# Altium integrated library vh_altium_library.intLib: 963 symbols (part 4 of 5)
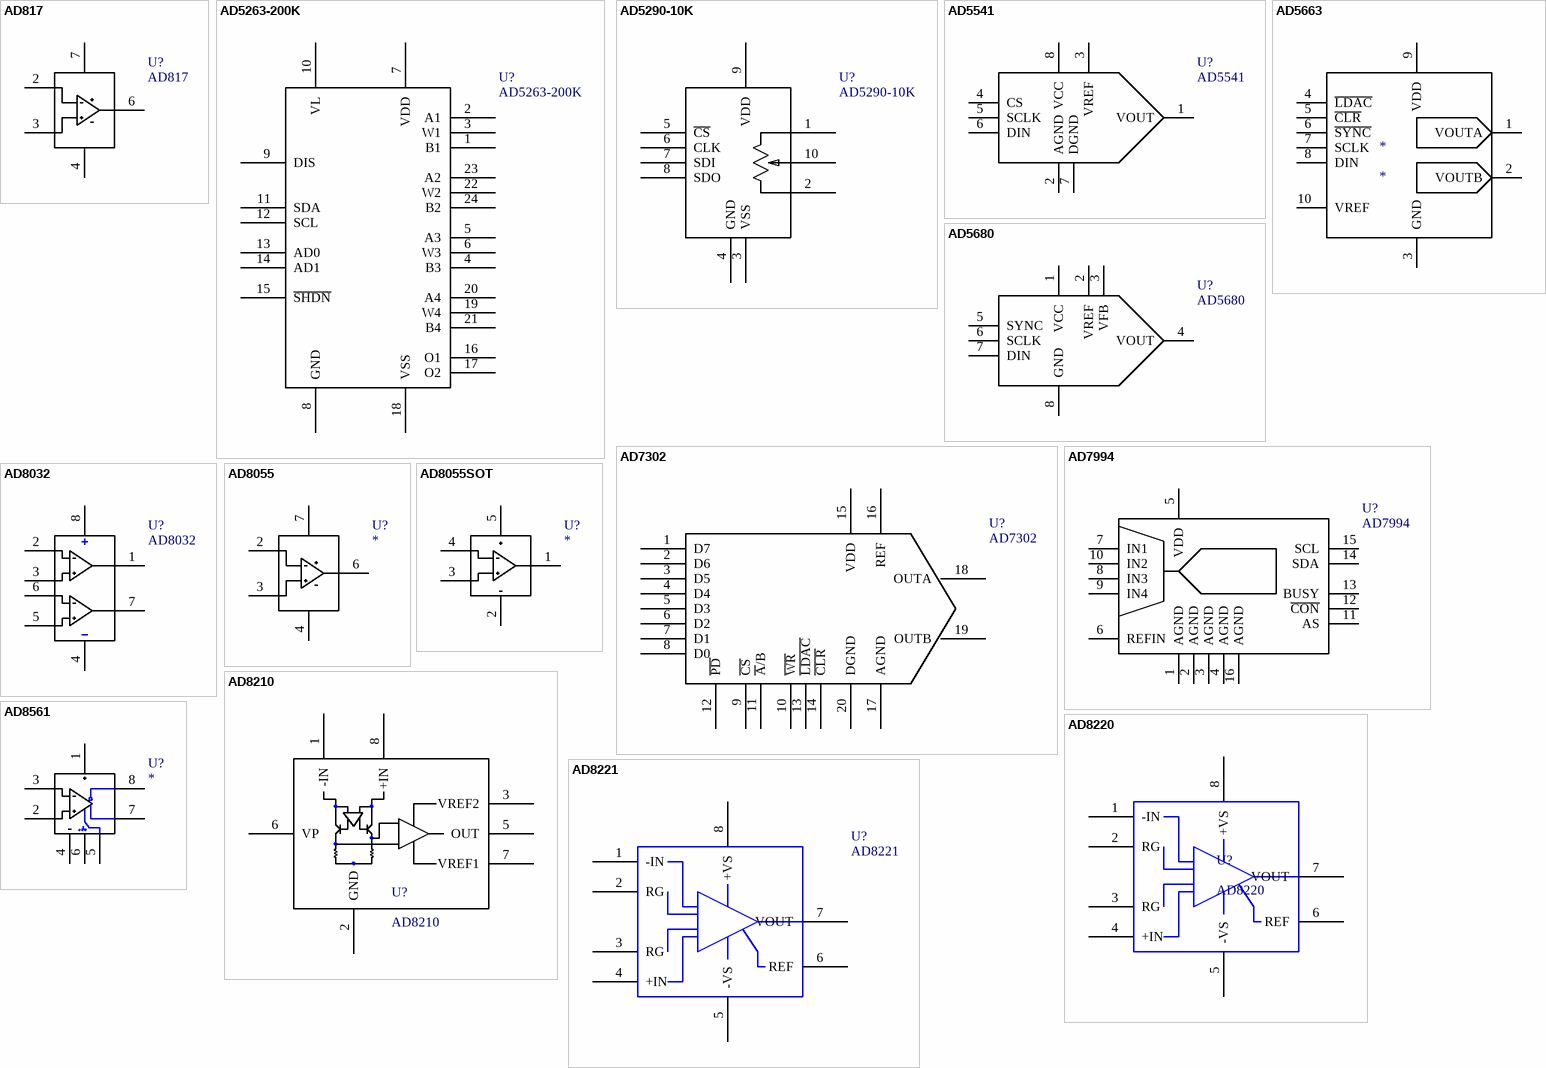
[diagram p71: symbols AD817 to AD8561]

## AD8055SOT
designator U?
OPAMP SOT23; Manufacturer Part Number: AD8055ARTZ-REEL7; Manufacturer: Analog Devices Inc; Text Field1: ST; Text Field2: LM2903DT; Text Field3: Avnet; Text Field5: SO8; Text Field6: 0.078; Current - Input Bias: 400nA; Number of Circuits: 1; Description: IC OPAMP VF LDIST LN LP SOT23-5; Current - Output / Channel: 60mA; Voltage - Input Offset: 3000µV; Amplifier Type: Voltage Feedback; Current - Supply: 5.4mA; Slew Rate: 1400 V/µs; Voltage - Supply, Single/Dual (±): 8 V ~ 12 V, ±4 V ~ 6 V; Text Field4: LM2903DT; NI?: *; O?: *; Section:: *; Supplier 1: Digi-Key; Supplier Part Number 1: AD8055ARTZ-REEL7TR-ND; Operating Temperature: -40°C ~ 125°C; Supplier: Digi-Key; Gain Bandwidth Product: -; Package / Case: SOT-23-5, SC-74A, SOT-25; Output Type: -; Supplier Part Number: AD8055ARTZ-REEL7TR-ND; Packaging: Tape & Reel (TR); Category: Integrated Circuits (ICs); RoHS: RoHS Compliant
footprint SOT23-5
pins: 1, 2, 3, 4, 5

## AD8210
designator U?
INSTRUMENTATION AMPLIFIER
footprint SO8
pins: 1 -IN, 2 GND, 3 VREF2, 5 OUT, 6 VP, 7 VREF1, 8 +IN

## AD8220
designator U?
INSTRUMENTATION AMPLIFIER; Manufacturer: Analog Devices Inc; Manufacturer Part Number: AD8220ARMZ-R7; Current - Input Bias: 25pA; Voltage - Supply, Single/Dual (±): 4.5 V ~ 36 V, ±2.25 V ~ 18 V; Voltage - Input Offset: 250µV; Current - Supply: 750µA; Current - Output / Channel: 15mA; Slew Rate: 2 V/µs; Description: IC AMP INST JFET R-R 15MA 8MSOP; Output Type: Rail-to-Rail; Number of Circuits: 1; Supplier 1: Digi-Key; Supplier Part Number 1: AD8220ARMZ-R7TR-ND; Package / Case: 8-MSOP, Micro8™, 8-uMAX, 8-uSOP,; Operating Temperature: -40°C ~ 85°C; Packaging: Tape & Reel (TR); Supplier Part Number: AD8220ARMZ-R7TR-ND; Gain Bandwidth Product: -; Amplifier Type: Instrumentation; RoHS: RoHS Compliant; Supplier: Digi-Key; Category: Integrated Circuits (ICs)
footprint MSOP8
pins: 1 -IN, 2 RG, 3 RG, 4 +IN, 5 -VS, 6 REF, 7 VOUT, 8 +VS

## AD8221
designator U?
INSTRUMENTATION AMPLIFIER; Manufacturer: Analog Devices Inc; Manufacturer Part Number: AD8221ARZ-RL; Current - Input Bias: 500pA; Description: IC AMP INST PREC LN 18MA 8SOIC; Voltage - Input Offset: 60µV; Voltage - Supply, Single/Dual (±): ±2.3 V ~ 18 V; Slew Rate: 2 V/µs; Number of Circuits: 1; Current - Supply: 900µA; Current - Output / Channel: 18mA; Supplier 1: Digi-Key; Supplier Part Number 1: AD8221ARZ-RL-ND; Package / Case: 8-SOIC (3.9mm Width); Output Type: -; Gain Bandwidth Product: -; Operating Temperature: -40°C ~ 85°C; Packaging: Tape & Reel (TR); RoHS: RoHS Compliant; Supplier: Digi-Key; Category: Integrated Circuits (ICs); Supplier Part Number: AD8221ARZ-RL-ND; Amplifier Type: Instrumentation
footprint SO8
pins: 1 -IN, 2 RG, 3 RG, 4 +IN, 5 -VS, 6 REF, 7 VOUT, 8 +VS

## AD8561
designator U?
ULTRAFAST COMPARATOR; Manufacturer Part Number: AD8561AR-REEL; Manufacturer: Analog Devices Inc; Text Field1: ST; Text Field2: LM2903DT; Text Field3: Avnet; Text Field5: SO8; Text Field6: 0.078; Output Type: CMOS, Complementary, TTL; Voltage - Supply: 3 V ~ 10 V, ±1.5 V ~ 5 V; Description: IC COMP 7NS ULTRA-FAST 8-SOIC; Number of Elements: 1; Text Field4: LM2903DT; NI?: *; O?: *; Section:: *; Supplier 1: Digi-Key; Supplier Part Number 1: AD8561AR-REEL-ND; Packaging: Tape & Reel (TR); Package / Case: 8-SOIC (3.9mm Width); Category: Integrated Circuits (ICs); Type: General Purpose; Supplier Part Number: AD8561AR-REEL-ND; Supplier: Digi-Key; RoHS: RoHS non-compliant
footprint SO8
pins: 1, 2, 3, 4, 5, 6, 7, 8

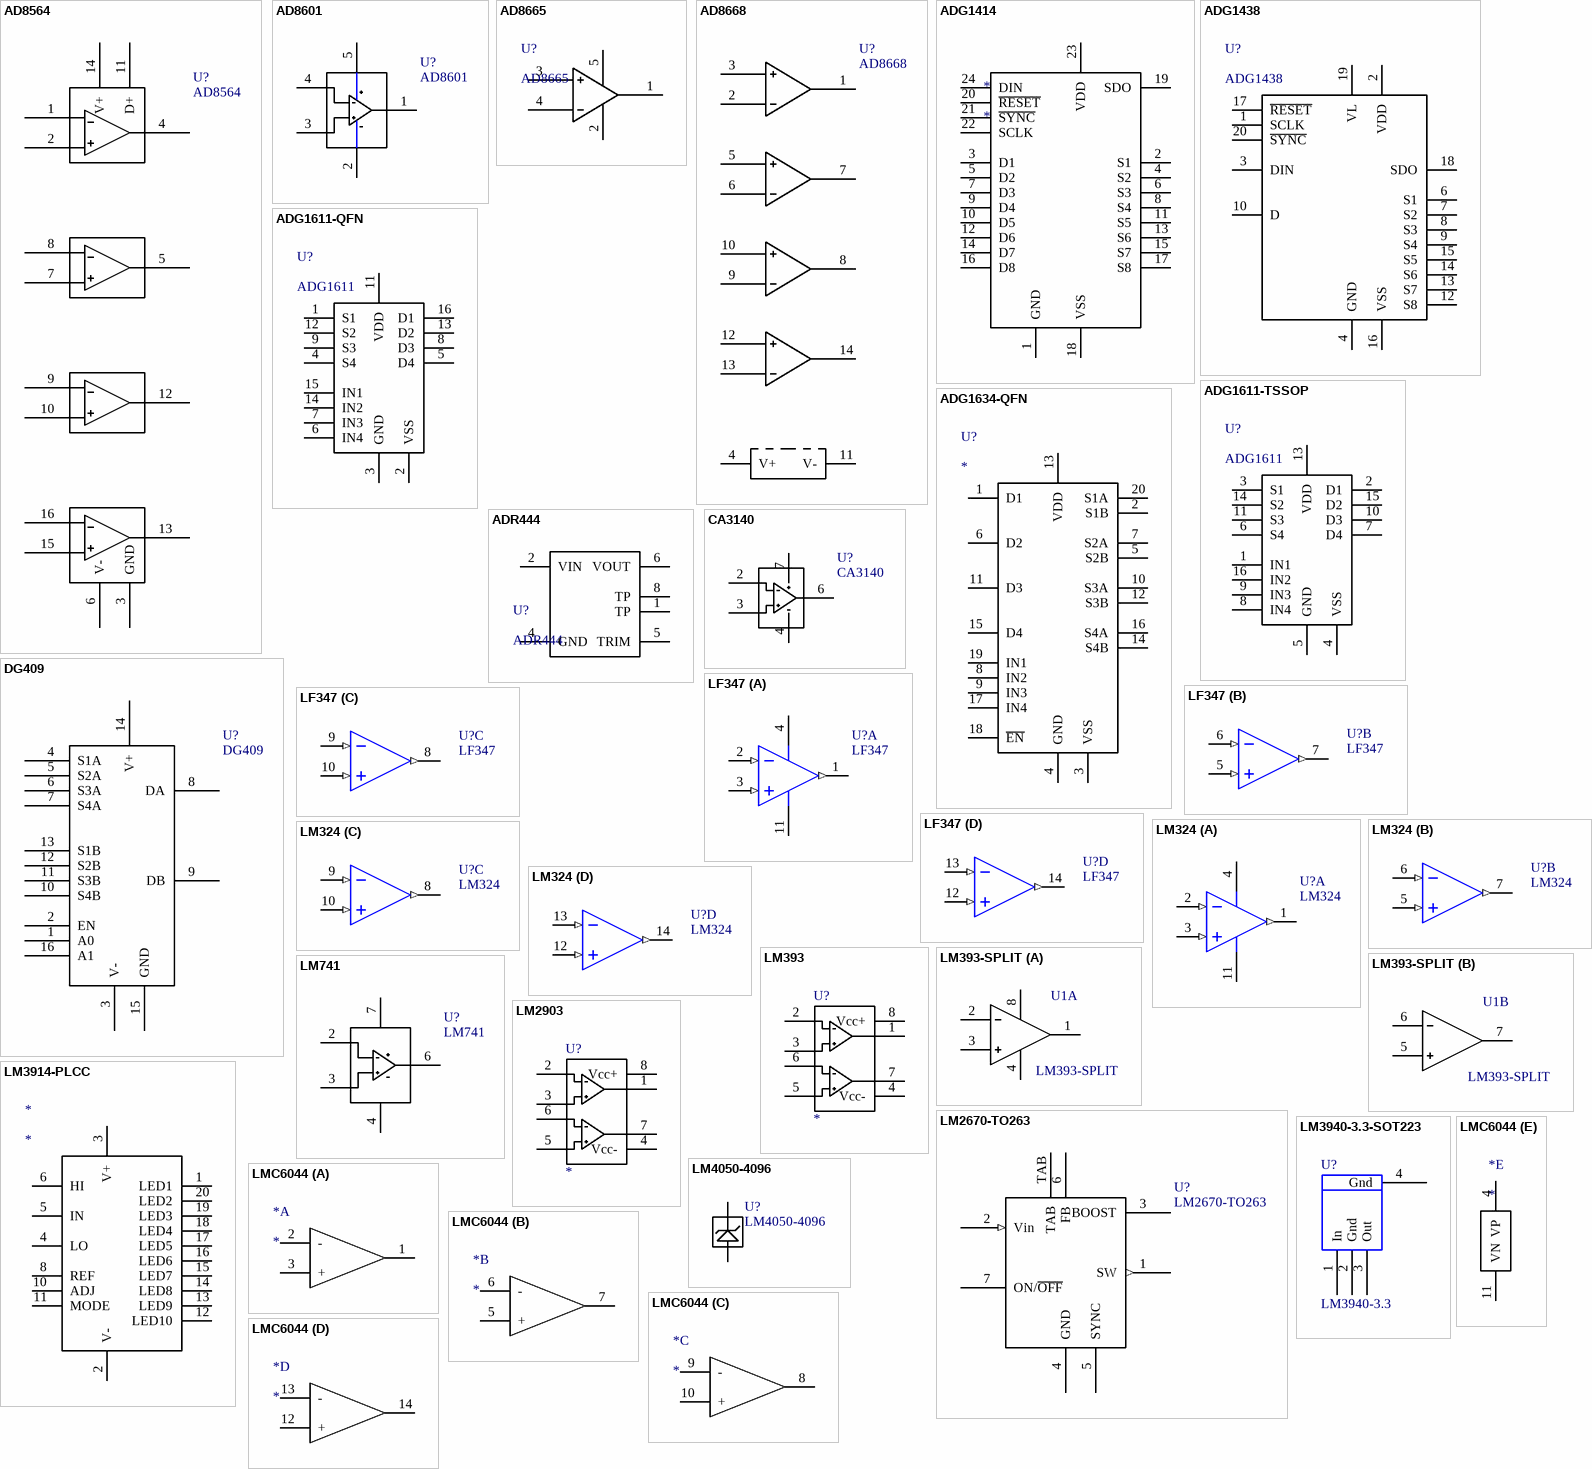
[diagram p41: symbols AD8564 to LMC6044]

## AD8564
designator U?
QUAD FAST COMPARATOR; Manufacturer Part Number: AD8564ARZ; Manufacturer: Analog Devices Inc; Description: IC COMPARATOR QUAD 7NS 16-SOIC; Output Type: CMOS, TTL; Number of Elements: 4; Supplier 1: Digi-Key; Supplier Part Number 1: AD8564ARZ-ND; Package / Case: 16-SOIC (3.9mm Width); RoHS: RoHS Compliant; Type: General Purpose; Packaging: Tube; Supplier: Digi-Key; Category: Integrated Circuits (ICs); Voltage - Supply: -; Supplier Part Number: AD8564ARZ-ND
footprint SO16
pins: 1 -A, 2 +A, 3 GND, 4 OA, 5 OB, 6 V-, 7 +B, 8 -B, 9 -C, 10 +C, 11 D+, 12 OC, 13 OD, 14 V+, 15 +D, 16 -D

## AD8601
designator U?
RAIL TO RAIL OPAMP; Manufacturer: Analog Devices Inc; Manufacturer Part Number: AD8601WDRTZ-REEL7; Text Field1: ST; Text Field2: LM2903DT; Text Field3: Avnet; Text Field5: SO8; Text Field6: 0.078; Voltage - Input Offset: 1300µV; Current - Supply: 750µA; Description: IC AMP GP R-R I/O SGL SOT23-5; Number of Circuits: 1; Slew Rate: 6 V/µs; Voltage - Supply, Single/Dual (±): 2.7 V ~ 5.5 V; Current - Input Bias: 0.2pA; Amplifier Type: General Purpose; Output Type: Rail-to-Rail; Current - Output / Channel: 50mA; Gain Bandwidth Product: 8.4MHz; Text Field4: LM2903DT; NI?: *; O?: *; Section:: *; Supplier 1: Digi-Key; Supplier Part Number 1: AD8601WDRTZ-REEL7CT-ND; RoHS: RoHS Compliant; Category: Integrated Circuits (ICs); Supplier Part Number: AD8601WDRTZ-REEL7CT-ND; Operating Temperature: -40°C ~ 125°C; Packaging: Cut Tape (CT); Supplier: Digi-Key; Package / Case: SOT-23-5, SC-74A, SOT-25
footprint SOT23-5
pins: 1, 2, 3, 4, 5

## AD8665
designator U?
Supplier 1: Digi-Key; Supplier Part Number 1: AD8665ARJZ-REEL7TR-ND
pins: 1 a, 2 VP, 3 +, 4 -, 5 VP

## AD8668
designator U?
QUAD COMPARATOR SO16; Manufacturer Part Number: LT1721CS; Manufacturer: Linear Technology; Output Type: CMOS, Rail-to-Rail, TTL; Description: IC COMP R-RINOUT QUAD 16-SOIC; Number of Elements: 4; Voltage - Supply: 2.7 V ~ 6 V; Supplier 1: Digi-Key; Supplier Part Number 1: LT1721CS-ND; Supplier: Digi-Key; RoHS: RoHS non-compliant; Type: General Purpose; Package / Case: 16-SOIC (3.9mm Width); Category: Integrated Circuits (ICs); Supplier Part Number: LT1721CS-ND; Packaging: Tube
footprint SO14
pins: 1 a, 2 -, 3 +, 4 V+, 5 +, 6 -, 7 b, 8 D, 9 -, 10 +, 11 V-, 12 +, 13 -, 14 C

## ADG1414
designator *
footprint LFCSP-24 (QFN, 24-Leads, Body 4.2x4.2mm (max), Pitch 0.50mm, IPC Medium Density)
pins: 1 GND, 2 S1, 3 D1, 4 S2, 5 D2, 6 S3, 7 D3, 8 S4, 9 D4, 10 D5, 11 S5, 12 D6, 13 S6, 14 D7, 15 S7, 16 D8, 17 S8, 18 VSS, 19 SDO, 20 ~{RESET}, 21 ~{SYNC}, 22 SCLK, 23 VDD, 24 DIN

## ADG1438
designator U?
footprint TSSOP20
pins: 1 SCLK, 2 VDD, 3 DIN, 4 GND, 6 S1, 7 S2, 8 S3, 9 S4, 10 D, 12 S8, 13 S7, 14 S6, 15 S5, 16 VSS, 17 ~{RESET}, 18 SDO, 19 VL, 20 ~{SYNC}

## ADG1611-QFN
designator U?, comment ADG1611
footprint LFCSP-16
pins: 1 S1, 2 VSS, 3 GND, 4 S4, 5 D4, 6 IN4, 7 IN3, 8 D3, 9 S3, 11 VDD, 12 S2, 13 D2, 14 IN2, 15 IN1, 16 D1

## ADG1611-TSSOP
designator U?, comment ADG1611
footprint TSSOP16
pins: 1 IN1, 2 D1, 3 S1, 4 VSS, 5 GND, 6 S4, 7 D4, 8 IN4, 9 IN3, 10 D3, 11 S3, 13 VDD, 14 S2, 15 D2, 16 IN2

## ADG1634-QFN
designator U?
footprint LFCSP-20
pins: 1 D1, 2 S1B, 3 VSS, 4 GND, 5 S2B, 6 D2, 7 S2A, 8 IN2, 9 IN3, 10 S3A, 11 D3, 12 S3B, 13 VDD, 14 S4B, 15 D4, 16 S4A, 17 IN4, 18 ~{EN}, 19 IN1, 20 S1A

## ADR444
designator U?
Supplier 1: Digi-Key; Supplier Part Number 1: ADR444ARZ-ND
pins: 1 TP, 2 VIN, 4 GND, 5 TRIM, 6 VOUT, 8 TP

## CA3140
designator U?
BIMOS OPAMP; Manufacturer: Intersil; Manufacturer Part Number: CA3140MZ; Text Field1: ST; Text Field2: LM2903DT; Text Field3: Avnet; Text Field5: SO8; Text Field6: 0.078; Voltage - Input Offset: 5000µV; Gain Bandwidth Product: 4.5MHz; Slew Rate: 9 V/µs; Current - Input Bias: 10pA; Voltage - Supply, Single/Dual (±): 4 V ~ 36 V, ±2 V ~ 18 V; Description: IC OPAMP BIMOS 4.5MHZ 8SOIC; Amplifier Type: General Purpose; Number of Circuits: 1; Current - Supply: 4mA; Current - Output / Channel: 40mA; Text Field4: LM2903DT; NI?: *; O?: *; Section:: *; Supplier 1: Digi-Key; Supplier Part Number 1: CA3140MZ-ND; Supplier: Digi-Key; Package / Case: 8-SOIC (3.9mm Width); Operating Temperature: -55°C ~ 125°C; RoHS: RoHS Compliant; Category: Integrated Circuits (ICs); Supplier Part Number: CA3140MZ-ND; Packaging: Tube; Output Type: -
footprint SO8
pins: 2, 3, 4, 6, 7

## DG409
designator U?
DIFFERENTIAL 4 CHANNEL MULTIPLEXER; Manufacturer Part Number: DG409DY-T1-E3; Manufacturer: Vishay/Siliconix; On-State Resistance: 100 Ohm; Voltage - Supply, Single/Dual (±): ±5 V ~ 20 V; Circuit: 2 x 4:2; Current - Supply: 1µA; Voltage Supply Source: Dual Supply; Description: IC MULTIPLEXER DUAL 4X1 16SOIC; Supplier 1: Digi-Key; Supplier Part Number 1: DG409DY-T1-E3DKR-ND; Function: Multiplexer; Mounting Type: Surface Mount; Operating Temperature: -40°C ~ 85°C; Category: Integrated Circuits (ICs); Supplier Part Number: DG409DY-T1-E3DKR-ND; Supplier: Digi-Key; Package / Case: 16-SOIC (3.9mm Width); Packaging: Digi-Reel®; RoHS: RoHS Compliant
footprint SO16
pins: 1 A0, 2 EN, 3 V-, 4 S1A, 5 S2A, 6 S3A, 7 S4A, 8 DA, 9 DB, 10 S4B, 11 S3B, 12 S2B, 13 S1B, 14 V+, 15 GND, 16 A1

## LF347
designator U?
Low Power Quad Operational Amplifier; Manufacturer Part Number: LF347BD; Manufacturer: Texas Instruments; Text Field1: pristel=Nsc\nsanopea\<parttype>.ckt; Slew Rate: 13 V/µs; Voltage - Supply, Single/Dual (±): 7 V ~ 36 V, ±3.5 V ~ 18 V; Current - Input Bias: 50pA; Voltage - Input Offset: 3000µV; Number of Circuits: 4; Gain Bandwidth Product: 3MHz; Description: IC OPAMP JFET 3MHZ QUAD 14SOIC; Amplifier Type: J-FET; Current - Supply: 8mA; Supplier 1: Digi-Key; Supplier Part Number 1: 296-7136-5-ND; Package / Case: 14-SOIC (3.9mm Width), 14-SOL; Supplier: Digi-Key; Current - Output / Channel: -; Packaging: Tube; RoHS: RoHS Compliant; Output Type: -; Operating Temperature: 0°C ~ 70°C; Category: Integrated Circuits (ICs); Supplier Part Number: 296-7136-5-ND
footprint SO14
part A pins: 1 1 OUT (out), 2 1 IN- (in), 3 1 IN+ (in), 4 VCC (power), 11 VEE (power)
part B pins: 5 2 IN+ (in), 6 2 IN- (in), 7 2 OUT (out)
part C pins: 8 3 OUT (out), 9 3 IN- (in), 10 3 IN+ (in)
part D pins: 12 4 IN+ (in), 13 4 IN- (in), 14 4 OUT (out)

## LM324
designator U?
Low Power Quad Operational Amplifier
footprint SO14
part A pins: 1 1 OUT (out), 2 1 IN- (in), 3 1 IN+ (in), 4 VCC (power), 11 VEE (power)
part B pins: 5 2 IN+ (in), 6 2 IN- (in), 7 2 OUT (out)
part C pins: 8 3 OUT (out), 9 3 IN- (in), 10 3 IN+ (in)
part D pins: 12 4 IN+ (in), 13 4 IN- (in), 14 4 OUT (out)

## LM393
designator U?
IC DUAL COMPARATOR
footprint SO8
pins: 1, 2, 3, 4 Vcc-, 5, 6, 7, 8 Vcc+

## LM393-SPLIT
designator U1
IC DUAL COMPARATOR; Supplier 1: Digi-Key; Supplier Part Number 1: LM393MXFSDKR-ND
footprint SO8
part A pins: 1, 2, 3, 4 Vcc-, 8 Vcc+
part B pins: 5, 6, 7

## LM741
designator U?
OPAMP
footprint SO8
pins: 2, 3, 4, 6, 7

## LM2670-TO263
designator U?
3A, HIGH EFFICIENCY STEP-DOWN VR; Manufacturer Part Number: LM2670S-3.3/NOPB; Text Field4: NATIONAL SEMICONDUCTOR; Text Field7: JAMES CHUNG; Description: IC REG SIMPLE SWITCHER TO-263-7; Voltage - Input: 8 ~ 40 V; Synchronous: Yes; Voltage - Output: 3.3V; Rds (On): 150 mOhm; Number of Outputs: 1; Frequency - Switching: 260kHz; Supplier 1: Digi-Key; Supplier Part Number 1: LM2670S-3.3-ND; Current - Output: 3A; Power - Output: -; Manufacturer: National Semiconductor; Operating Temperature: -40°C ~ 125°C; Supplier: Digi-Key; Category: Integrated Circuits (ICs); Package / Case: D²Pak, TO-263 (7 leads + tab); Supplier Part Number: LM2670S-3.3-ND; Type: Step-Down (Buck); Packaging: Tube; Internal Switch(s): Yes; RoHS: RoHS Compliant
footprint TO263-7
pins: 1 SW (out), 2 Vin (in), 3 BOOST, 4 GND (power), 5 SYNC, 6 FB, 7 ON/~{OFF}, TAB

## LM2903
designator U?
IC DUAL COMPARATOR; Manufacturer: STMicroelectronics; Manufacturer Part Number: LM2903HDT; Text Field1: ST; Text Field2: LM2903DT; Text Field3: Avnet; Text Field5: SO8; Text Field6: 0.078; Voltage - Supply: 2 V ~ 36 V, ±1 V ~ 18 V; Output Type: CMOS, DTL, ECL, MOS, Open-Collector, TTL; Description: IC COMPARATOR DUAL LOW PWR 8SOIC; Number of Elements: 2; Text Field4: LM2903DT; NI?: *; O?: *; Section:: *; Supplier 1: Digi-Key; Supplier Part Number 1: 497-4260-2-ND; RoHS: RoHS non-compliant; Package / Case: 8-SOIC (3.9mm Width); Supplier Part Number: 497-4260-2-ND; Type: General Purpose; Supplier: Digi-Key; Category: Integrated Circuits (ICs); Packaging: Tape & Reel (TR)
footprint SO8
pins: 1, 2, 3, 4 Vcc-, 5, 6, 7, 8 Vcc+

## LM3914-PLCC
designator *
Supplier 1: Digi-Key; Supplier Part Number 1: LM3914V-ND
footprint PLCC20 (Footprint not found)
pins: 1 LED1, 2 V-, 3 V+, 4 LO, 5 IN, 6 HI, 8 REF, 10 ADJ, 11 MODE, 12 LED10, 13 LED9, 14 LED8, 15 LED7, 16 LED6, 17 LED5, 18 LED4, 19 LED3, 20 LED2

## LM3940-3.3-SOT223
designator U?, comment LM3940-3.3
3.3 VOLT LINEAR REGULATOR SOT223; Manufacturer: National Semiconductor; Manufacturer Part Number: LM3940IMP-3.3/NOPB; Description: IC REGULATOR LDO 3.3V SOT223-3; Number of Regulators: 1; Regulator Topology: Positive Fixed; Voltage - Output: 3.3V; Current - Output: 1A; Voltage - Input: 4.5 ~ 5.5 V; Voltage - Dropout (Typical): 0.11V @ 100mA; Supplier 1: Digi-Key; Supplier Part Number 1: LM3940IMP-3.3DKR-ND; Package / Case: SOT-223 (3 leads + Tab), SC-73, TO-261AA; Operating Temperature: -40°C ~ 125°C; Supplier Part Number: LM3940IMP-3.3DKR-ND; Supplier: Digi-Key; Current - Limit (Min): -; Packaging: Digi-Reel®; RoHS: RoHS Compliant; Category: Integrated Circuits (ICs)
footprint SOT223
pins: 1 In, 2 Gnd, 3 Out, 4 Gnd

## LM4050-4096
designator U?
REFERENCE DIODE 4.096 VOLT; Manufacturer Part Number: LT1962EMS8-1.5#PBF; Manufacturer: Linear Technology; Tolerance: ±0.2%; Description: IC REG LDO 1.5V 300MA LN 8MSOP; Temperature Coefficient: 50ppm/°C; Number of Channels: 1; Voltage - Output: 1.5V; Reference Type: Shunt; Voltage - Input: 1.8 ~ 20 V; Current - Output: 300mA; Current - Cathode: 60µA; Voltage - Dropout (Typical): 0.27V @ 300mA; Current - Limit (Min): 320mA; Regulator Topology: Positive Fixed; Supplier 1: Digi-Key; Supplier Part Number 1: LM4050BIM3-2.5DKR-ND; Supplier Part Number: LM4050BIM3-2.5DKR-ND; RoHS: RoHS Compliant; Supplier: Digi-Key; Package / Case: 8-MSOP, Micro8™, 8-uMAX, 8-uSOP,; Packaging: Tube; Category: Integrated Circuits (ICs); Operating Temperature: -40°C ~ 125°C; Current - Quiescent: -; Number of Regulators: 1
footprint SOT23-123
pins: 1, 2

## LMC6044
designator *
Supplier 1: Digi-Key; Supplier Part Number 1: LMC6044AIMX-ND
footprint SO14
part A pins: 1, 2 -, 3 +
part B pins: 5 +, 6 -, 7
part C pins: 8, 9 -, 10 +
part D pins: 12 +, 13 -, 14
part E pins: 4 VP, 11 VN

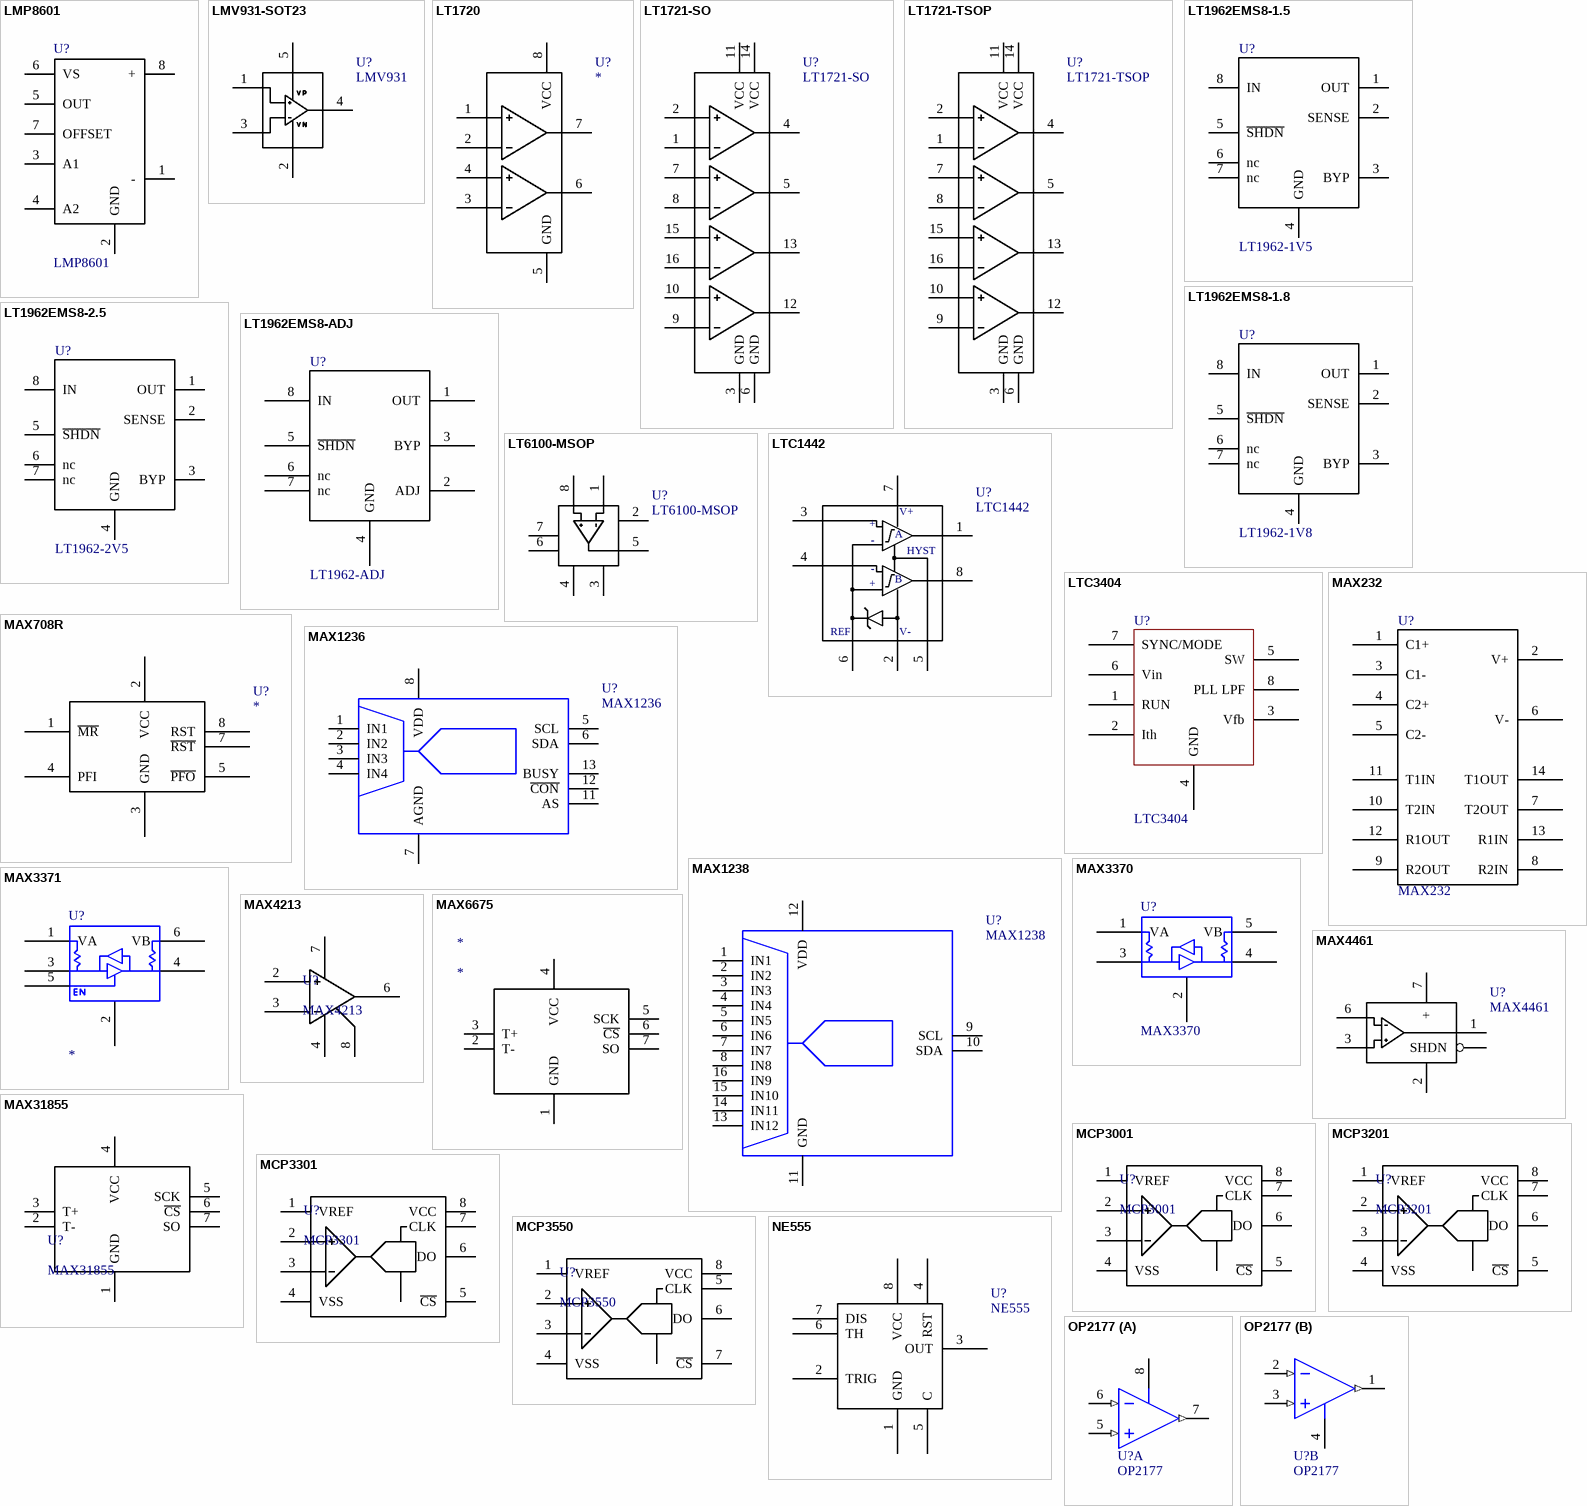
[diagram p42: symbols LMP8601 to OP2177]

## LMP8601
designator U?
CURRENT SENSING AMPLIFIER; Manufacturer Part Number: LMP8601MA/NOPB; Manufacturer: National Semiconductor; Amplifier Type: Current Sense; Number of Circuits: 1; Current - Input Bias: 0.04pA; Description: IC AMP CURRENT SENSE 60V 8SOIC; Current - Supply: 1.1mA; Current - Output / Channel: 48mA; Slew Rate: 0.83 V/µs; Gain Bandwidth Product: 60kHz; Voltage - Input Offset: 150µV; Voltage - Supply, Single/Dual (±): 3 V ~ 5.5 V; Supplier 1: Digi-Key; Supplier Part Number 1: LMP8601MA-ND; Output Type: -; Operating Temperature: -40°C ~ 125°C; RoHS: RoHS Compliant; Supplier Part Number: LMP8601MA-ND; Package / Case: 8-SOIC (3.9mm Width); Packaging: Tube; Supplier: Digi-Key; Category: Integrated Circuits (ICs)
footprint SO8
pins: 1 -, 2 GND, 3 A1, 4 A2, 5 OUT, 6 VS, 7 OFFSET, 8 +

## LMV931-SOT23
designator U?, comment LMV931
OPAMP; Supplier 1: Digi-Key; Supplier Part Number 1: LMV931MFCT-ND
footprint SOT23-5
pins: 1, 2, 3, 4, 5

## LT1720
designator U?
DUAL COMPARATOR; Manufacturer: Linear Technology; Manufacturer Part Number: LT1720CS8#PBF; Output Type: CMOS, Rail-to-Rail, TTL; Number of Elements: 2; Voltage - Supply: 2.7 V ~ 6 V; Description: IC COMP R-RINOUT DUAL 8-SOIC; Supplier 1: Digi-Key; Supplier Part Number 1: LT1720CS8#PBF-ND; Package / Case: 8-SOIC (3.9mm Width); Category: Integrated Circuits (ICs); Packaging: Tube; RoHS: RoHS Compliant; Type: General Purpose; Supplier: Digi-Key; Supplier Part Number: LT1720CS8#PBF-ND
footprint SO8
pins: 1, 2 -, 3 -, 4 +, 5 GND, 6 b, 7 a, 8 VCC

## LT1721-SO
designator U?
QUAD COMPARATOR SO16; Manufacturer Part Number: LT1721CS; Manufacturer: Linear Technology; Output Type: CMOS, Rail-to-Rail, TTL; Description: IC COMP R-RINOUT QUAD 16-SOIC; Number of Elements: 4; Voltage - Supply: 2.7 V ~ 6 V; Supplier 1: Digi-Key; Supplier Part Number 1: LT1721CS-ND; Supplier: Digi-Key; RoHS: RoHS non-compliant; Type: General Purpose; Package / Case: 16-SOIC (3.9mm Width); Category: Integrated Circuits (ICs); Supplier Part Number: LT1721CS-ND; Packaging: Tube
footprint SO16
pins: 1 -, 2 +, 3 GND, 4 a, 5 b, 6 GND, 7 +, 8 -, 9 -, 10 +, 11 VCC, 12 C, 13 D, 14 VCC, 15 +, 16 -